# Altium footprint library andylib.PcbLib: 158 footprints (part 6 of 10)
Each footprint in its own frame and in the unit in brackets; x right, y up, seen from the top. Pads: shape width x height; smd on the part's side, far side on the other; paste and mask are expansions set on the pad; w line width, h text height; cw(c..) or ccw(c..) is an arc to the next point about the centre after c.
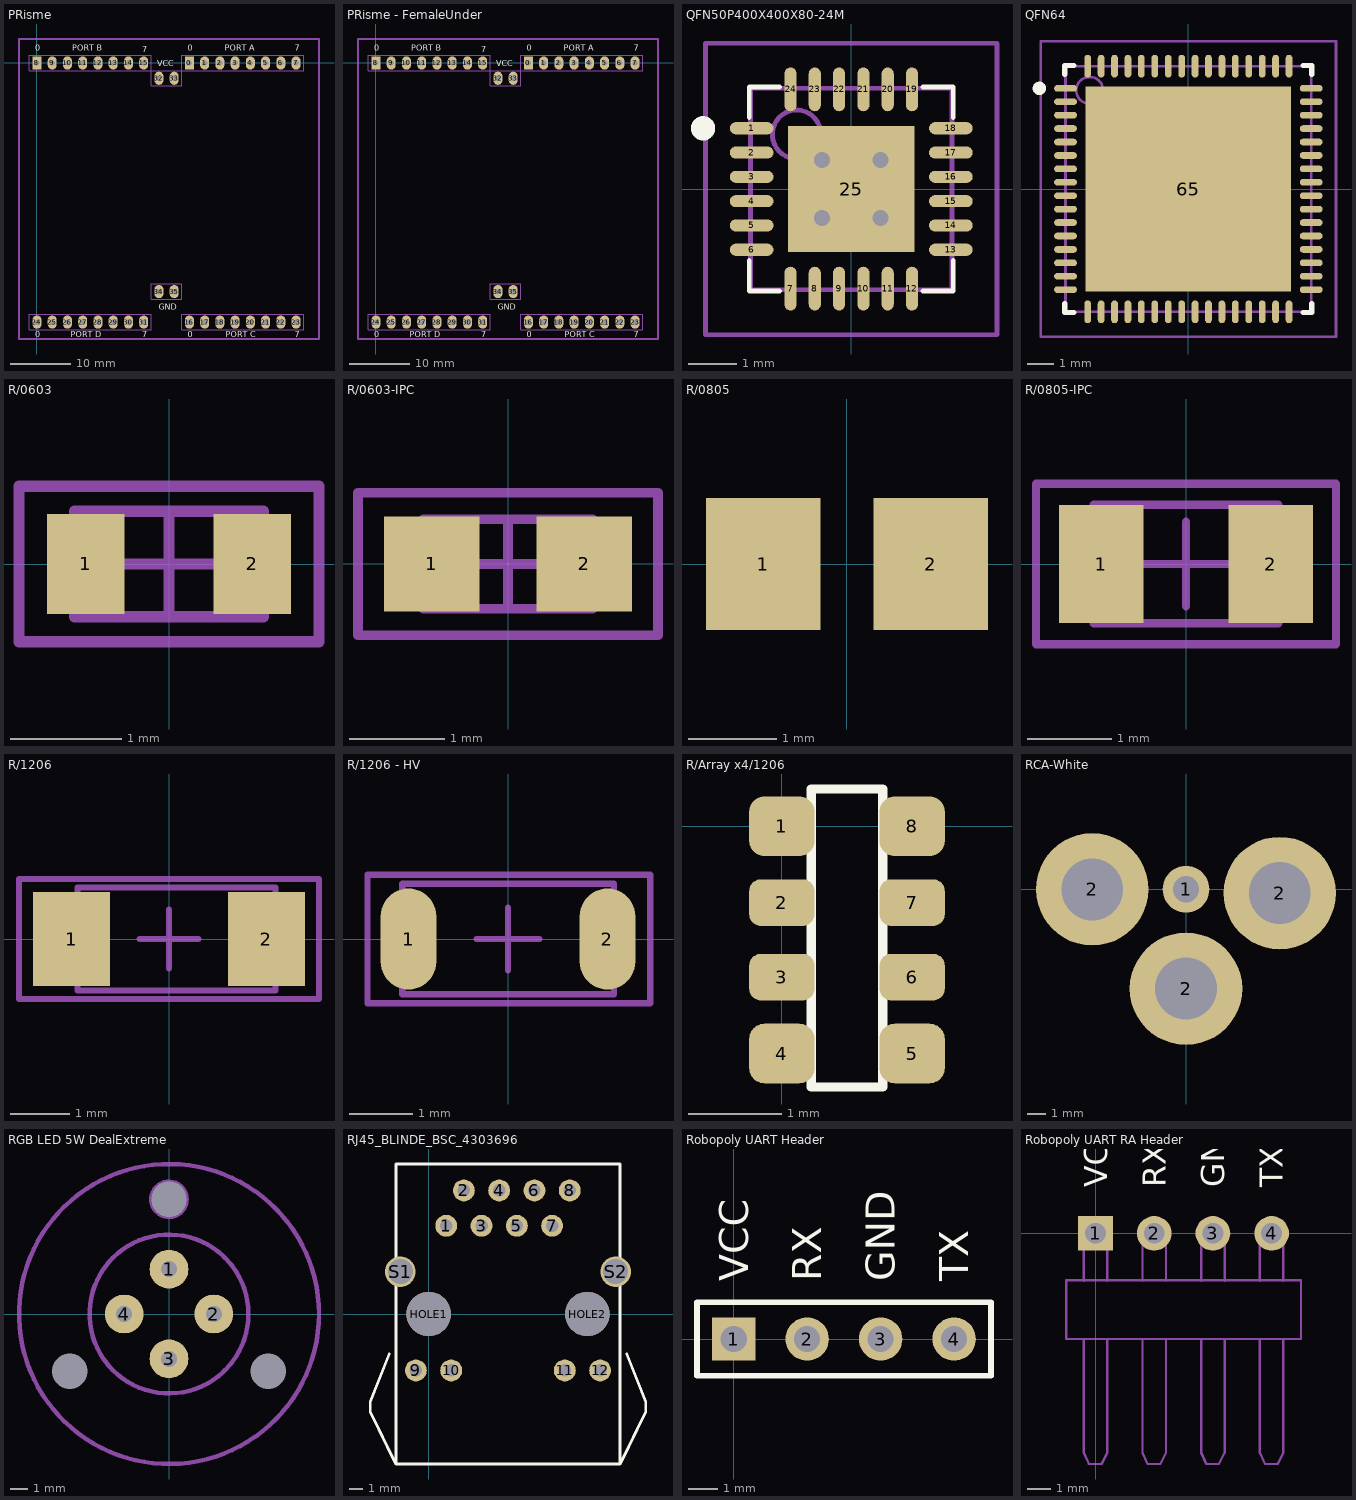
[diagram p5: the footprints below, top view; thin cyan lines are the x and y axes]

## PRisme [mm] "Robopoly PRisme"
pads (36):
  rect 1.5x2.2 hole 0.9: 0(25.4,0) 8(0,0)
  oval 1.5x2.2 hole 0.9: 1(27.94,0) 2(30.48,0) 3(33.02,0) 4(35.56,0) 5(38.1,0) 6(40.64,0) 7(43.18,0) 9(2.54,0) 10(5.08,0) 11(7.62,0) 12(10.16,0) 13(12.7,0) 14(15.24,0) 15(17.78,0) 16(25.4,-43.18) 17(27.94,-43.18) 18(30.48,-43.18) 19(33.02,-43.18) 20(35.56,-43.18) 21(38.1,-43.18) 22(40.64,-43.18) 23(43.18,-43.18) 24(0,-43.18) 25(2.54,-43.18) 26(5.08,-43.18) 27(7.62,-43.18) 28(10.16,-43.18) 29(12.7,-43.18) 30(15.24,-43.18) 31(17.78,-43.18) 32(20.32,-2.54) 33(22.86,-2.54) 34(20.32,-38.1) 35(22.86,-38.1)
Top Overlay:
  text "7" at 17.526,1.778 h1
  text "7" at 42.926,2.032 h1
  text "7" at 42.926,-45.72 h1
  text "7" at 17.526,-45.72 h1
  text "0" at 25.146,-45.72 h1
  text "0" at -0.254,-45.72 h1
  text "0" at -0.254,2.032 h1
  text "0" at 25.146,2.032 h1
  text "GND" at 20.32,-41.148 h1
  text "VCC" at 20.066,-0.508 h1
  text "PORT A" at 31.3,2 h1
  text "PORT B" at 5.9,2 h1
  text "PORT C" at 31.496,-45.72 h1
  text "PORT D" at 5.588,-45.72 h1
Mechanical 13:
  lines w0.2: 19.05,-1.27 19.05,1.27 -1.27,1.27 -1.27,-1.27 19.05,-1.27 ; 19.05,-1.27 24.13,-1.27 ; 19.05,-1.27 19.05,-3.81 24.13,-3.81 24.13,-1.27 ; 24.13,-1.27 24.13,1.27 44.45,1.27 44.45,-1.27 24.13,-1.27 ; -1.27,-44.45 19.05,-44.45 19.05,-41.91 -1.27,-41.91 -1.27,-44.45 ; 19.05,-39.37 24.13,-39.37 24.13,-36.83 19.05,-36.83 19.05,-39.37 ; 24.13,-44.45 44.45,-44.45 44.45,-41.91 24.13,-41.91 24.13,-44.45
  lines w0.3: -3,-46 -3,4 47,4 47,-46 -3,-46

## PRisme - FemaleUnder [mm] "Robopoly PRisme - Underside Female Connectors"
pads (36):
  rect 1.5x2.2 hole 0.9: 0(25.4,0) 8(0,0)
  oval 1.5x2.2 hole 0.9: 1(27.94,0) 2(30.48,0) 3(33.02,0) 4(35.56,0) 5(38.1,0) 6(40.64,0) 7(43.18,0) 9(2.54,0) 10(5.08,0) 11(7.62,0) 12(10.16,0) 13(12.7,0) 14(15.24,0) 15(17.78,0) 16(25.4,-43.18) 17(27.94,-43.18) 18(30.48,-43.18) 19(33.02,-43.18) 20(35.56,-43.18) 21(38.1,-43.18) 22(40.64,-43.18) 23(43.18,-43.18) 24(0,-43.18) 25(2.54,-43.18) 26(5.08,-43.18) 27(7.62,-43.18) 28(10.16,-43.18) 29(12.7,-43.18) 30(15.24,-43.18) 31(17.78,-43.18) 32(20.32,-2.54) 33(22.86,-2.54) 34(20.32,-38.1) 35(22.86,-38.1)
Top Overlay:
  text "PORT D" at 5.588,-45.72 h1
  text "PORT C" at 31.496,-45.72 h1
  text "PORT B" at 5.9,2 h1
  text "PORT A" at 31.3,2 h1
  text "VCC" at 20.066,-0.508 h1
  text "GND" at 20.32,-41.148 h1
  text "0" at 25.146,2.032 h1
  text "0" at -0.254,2.032 h1
  text "0" at -0.254,-45.72 h1
  text "0" at 25.146,-45.72 h1
  text "7" at 17.526,-45.72 h1
  text "7" at 42.926,-45.72 h1
  text "7" at 42.926,2.032 h1
  text "7" at 17.526,1.778 h1
Mechanical 13:
  lines w0.2: 19.05,-1.27 19.05,-3.81 24.13,-3.81 24.13,-1.27 ; 19.05,-1.27 24.13,-1.27 ; 19.05,-1.27 -1.27,-1.27 -1.27,1.27 19.05,1.27 19.05,-1.27 ; 24.13,-1.27 44.45,-1.27 44.45,1.27 24.13,1.27 24.13,-1.27 ; -1.27,-44.45 -1.27,-41.91 19.05,-41.91 19.05,-44.45 -1.27,-44.45 ; 19.05,-39.37 19.05,-36.83 24.13,-36.83 24.13,-39.37 19.05,-39.37 ; 24.13,-44.45 24.13,-41.91 44.45,-41.91 44.45,-44.45 24.13,-44.45
  lines w0.3: -3,-46 47,-46 47,4 -3,4 -3,-46
3D body: height 2.75, standoff -8.9, extent -1.395,-44.298 19.175,-41.798
3D body: height 2.75, standoff -8.9, extent 24.005,-44.43 44.575,-41.93
3D body: height 2.75, standoff -8.9, extent 24.005,-1.25 44.575,1.25
3D body: height 2.75, standoff -8.9, extent -1.395,-1.25 19.175,1.25
3D body: height 2.75, standoff -8.9, extent 18.925,-39.35 24.255,-36.85
3D body: height 2.75, standoff -8.9, extent 18.925,-3.79 24.255,-1.29

## QFN50P400X400X80-24M [mm] "QFN, 24-Leads, Body 4.2x4.2mm (max), Pitch 0.50mm, IPC Low Density"
height 0.8
pads (25):
  oval 0.9x0.25 smd: 1(-2.05,1.25) 2(-2.05,0.75) 3(-2.05,0.25) 4(-2.05,-0.25) 5(-2.05,-0.75) 6(-2.05,-1.25) 13(2.05,-1.25) 14(2.05,-0.75) 15(2.05,-0.25) 16(2.05,0.25) 17(2.05,0.75) 18(2.05,1.25)
  oval 0.25x0.9 smd: 7(-1.25,-2.05) 8(-0.75,-2.05) 9(-0.25,-2.05) 10(0.25,-2.05) 11(0.75,-2.05) 12(1.25,-2.05) 19(1.25,2.05) 20(0.75,2.05) 21(0.25,2.05) 22(-0.25,2.05) 23(-0.75,2.05) 24(-1.25,2.05)
  rect 2.6x2.6 smd: 25(0,0)
via 0.6,-0.6 diameter 0.66 hole 0.33
via -0.6,-0.6 diameter 0.66 hole 0.33
via 0.6,0.6 diameter 0.66 hole 0.33
via -0.6,0.6 diameter 0.66 hole 0.33
Top Overlay:
  circle w0.25: c-3.05,1.25 r0.125
  lines w0.1: -2.1,-1.475 -2.1,-2.1 -1.475,-2.1 ; -2.1,1.475 -2.1,2.1 -1.475,2.1 ; 1.475,-2.1 2.1,-2.1 2.1,-1.475 ; 1.475,2.1 2.1,2.1 2.1,1.475
Mechanical 13:
  circle w0.1: c-1.125,1.125 r0.5
  lines w0.1: -2.075,-2.075 2.075,-2.075 2.075,2.075 -2.075,2.075 -2.075,-2.075
Mechanical 15:
  lines w0.1: -0.5,0 0.5,0 ; 0,-0.5 0,0.5 ; -3,-3 3,-3 3,3 -3,3 -3,-3
3D body: height 0.8, standoff 0.08, extent -2.075,-2.075 2.075,2.075

## QFN64 [mm] "Quad Flat No Leads"
pads (65):
  oval 0.85x0.25 smd: 1(-4.575,3.75) 2(-4.575,3.25) 3(-4.575,2.75) 4(-4.575,2.25) 5(-4.575,1.75) 6(-4.575,1.25) 7(-4.575,0.75) 8(-4.575,0.25) 9(-4.575,-0.25) 10(-4.575,-0.75) 11(-4.575,-1.25) 12(-4.575,-1.75) 13(-4.575,-2.25) 14(-4.575,-2.75) 15(-4.575,-3.25) 16(-4.575,-3.75) 33(4.575,-3.75) 34(4.575,-3.25) 35(4.575,-2.75) 36(4.575,-2.25) 37(4.575,-1.75) 38(4.575,-1.25) 39(4.575,-0.75) 40(4.575,-0.25) 41(4.575,0.25) 42(4.575,0.75) 43(4.575,1.25) 44(4.575,1.75) 45(4.575,2.25) 46(4.575,2.75) 47(4.575,3.25) 48(4.575,3.75)
  oval 0.25x0.85 smd: 17(-3.75,-4.575) 18(-3.25,-4.575) 19(-2.75,-4.575) 20(-2.25,-4.575) 21(-1.75,-4.575) 22(-1.25,-4.575) 23(-0.75,-4.575) 24(-0.25,-4.575) 25(0.25,-4.575) 26(0.75,-4.575) 27(1.25,-4.575) 28(1.75,-4.575) 29(2.25,-4.575) 30(2.75,-4.575) 31(3.25,-4.575) 32(3.75,-4.575) 49(3.75,4.575) 50(3.25,4.575) 51(2.75,4.575) 52(2.25,4.575) 53(1.75,4.575) 54(1.25,4.575) 55(0.75,4.575) 56(0.25,4.575) 57(-0.25,4.575) 58(-0.75,4.575) 59(-1.25,4.575) 60(-1.75,4.575) 61(-2.25,4.575) 62(-2.75,4.575) 63(-3.25,4.575) 64(-3.75,4.575)
  rect 7.65x7.65 smd: 65(0,0)
Top Overlay:
  circle w0.25: c-5.55,3.75 r0.125
  lines w0.2: -4.6,-4.275 -4.6,-4.6 -4.275,-4.6 ; -4.6,4.275 -4.6,4.6 -4.275,4.6 ; 4.275,-4.6 4.6,-4.6 4.6,-4.275 ; 4.275,4.6 4.6,4.6 4.6,4.275
Mechanical 13:
  circle w0.1: c-3.675,3.675 r0.5
  lines w0.1: -4.575,-4.575 4.575,-4.575 4.575,4.575 -4.575,4.575 -4.575,-4.575
Mechanical 15:
  lines w0.1: -0.5,0 0.5,0 ; 0,-0.5 0,0.5 ; -5.5,-5.5 5.5,-5.5 5.5,5.5 -5.5,5.5 -5.5,-5.5
3D body: height 1, standoff 0, extent -4.578,-4.578 4.572,4.572

## R/0603 [mm] "Chip Resistor, Body 1.6x0.8mm, IPC High Density"
height 0.9
pads (2):
  rect 0.7x0.9 smd: 1(-0.75,0) 2(0.75,0)
Mechanical 13:
  lines w0.1: -0.85,-0.475 0.85,-0.475 0.85,0.475 -0.85,0.475 -0.85,-0.475
Mechanical 15:
  lines w0.1: -0.475,0 0.475,0 ; 0,-0.475 0,0.475 ; -1.35,-0.7 1.35,-0.7 1.35,0.7 -1.35,0.7 -1.35,-0.7
3D body: height 0.3, standoff 0, extent -0.8,-0.4 0.8,0.4

## R/0603-IPC [mm] "Chip Resistor, 2-Leads, Body 1.6x0.8mm, IPC Medium Density"
height 0.38
pads (2):
  rect 1x1 smd: 1(-0.8,0) 2(0.8,0)
Mechanical 13:
  lines w0.1: -0.89,-0.47 -0.89,0.47 0.89,0.47 0.89,-0.47 -0.89,-0.47
Mechanical 15:
  lines w0.1: -0.47,0 0.47,0 ; 0,-0.47 0,0.47 ; -1.575,-0.75 -1.575,0.75 1.575,0.75 1.575,-0.75 -1.575,-0.75
3D body: height 0.3, standoff 0, extent -0.8,-0.425 0.8,0.375

## R/0805 [mm] "Chip Resistor; Body 2.0 x 1.3 mm (LxW typ)"
height 2.54
pads (2):
  rect 1.3x1.5 smd: 1(-0.95,0) 2(0.95,0)
3D body: height 0.78, standoff 0, extent -1,-0.615 1,0.635

## R/0805-IPC [mm] "Chip Resistor, 2-Leads, Body 2.0x1.3mm, IPC Medium Density"
height 0.38
pads (2):
  rect 1x1.4 smd: 1(-1,0) 2(1,0)
Mechanical 13:
  lines w0.1: -1.09,-0.7 -1.09,0.7 1.09,0.7 1.09,-0.7 -1.09,-0.7
Mechanical 15:
  lines w0.1: -0.5,0 0.5,0 ; 0,-0.5 0,0.5 ; -1.775,-0.95 -1.775,0.95 1.775,0.95 1.775,-0.95 -1.775,-0.95
3D body: height 0.78, standoff 0, extent -1,-0.625 1,0.625

## R/1206 [mm] "Chip Resistor, Body 3.2x1.6mm, IPC Low Density"
height 0.71
pads (2):
  rect 1.3x1.6 smd: 1(-1.651,0) 2(1.651,0)
Mechanical 13:
  lines w0.1: -1.548,-0.875 -1.548,0.875 1.802,0.875 1.802,-0.875 -1.548,-0.875
Mechanical 15:
  lines w0.1: -0.5,0 0.5,0 ; 0,-0.5 0,0.5 ; -2.54,-1.016 -2.54,1.016 2.54,1.016 2.54,-1.016 -2.54,-1.016
3D body: height 1, standoff 0, extent -1.6,-0.8 1.6,0.8

## R/1206 - HV [mm] "Chip Resistor, Body 3.2x1.6mm, High Voltage"
height 0.71
pads (2):
  oval 0.88x1.6 smd: 1(-1.575,0) 2(1.575,0)
Top Solder:
  rectangle: -2.125,-0.95 2.125,0.925
Mechanical 13:
  lines w0.1: -1.673,-0.875 -1.673,0.875 1.677,0.875 1.677,-0.875 -1.673,-0.875
Mechanical 15:
  lines w0.1: -0.5,0 0.5,0 ; 0,-0.5 0,0.5 ; -2.225,-1.016 -2.225,1.016 2.25,1.016 2.25,-1.016 -2.225,-1.016
3D body: height 1, standoff 0, extent -1.6,-0.8 1.6,0.8

## R/Array x4/1206 [mm] "4x0603 (Total 1206)"
pads (8):
  rrect50% 0.7x0.64 smd: 1(0,0) 4(0,-2.44) 5(1.4,-2.44) 8(1.4,0)
  rrect50% 0.7x0.5 smd: 2(0,-0.82) 3(0,-1.62) 6(1.4,-1.62) 7(1.4,-0.82)
Top Overlay:
  lines w0.1: 0.5,0.4 1.085,0.4 1.085,-2.8 0.315,-2.8 0.315,0.4 0.9,0.4
3D body: height 0.5, standoff 0, extent -0.165,-2.819 1.435,0.381

## RCA-White [mm] "RCA Through Hole Jack - White"
height 12
pads (4):
  round 2.5 hole 1.4: 1(0,0)
  round 6 hole 3.3: 2(-5,0) 2(0,-5.3) 2(5,-0.2)
3D body: height 12, standoff -4.2, extent -5.8,-13.1 5.8,1.4

## RGB LED 5W DealExtreme [mm] "5W RGB LED from DealExtreme / SKU 20999"
pads (7):
  round 0 hole 2 unplated paste+0 mask+0: 0(-5.63,-3.25) 0(0,6.5) 0(5.63,-3.25)
  round 2.2 hole 0.9 unplated paste+0 mask+0: 1(0,2.54) 2(2.54,0) 3(0,-2.54) 4(-2.54,0)
Mechanical 13:
  circle w0.254: c0,6.5 r1
  circle w0.254: c0,0 r4.5
  circle w0.254: c0,0 r8.5
3D body: height 6, standoff -15, extent -8.5,-8.5 8.5,8.5

## RJ45_BLINDE_BSC_4303696 [mm]
pads (16):
  round 1.574 / inner round 1.778 / far side round 1.574 hole 0.9 mask+0.128: 1(1.27,6.35) 2(2.54,8.89) 3(3.81,6.35) 4(5.08,8.89) 5(6.35,6.35) 6(7.62,8.89) 7(8.89,6.35) 8(10.16,8.89) 9(-0.914,-4.064) 10(1.626,-4.064) 11(9.804,-4.064) 12(12.344,-4.064)
  round 3.2 hole 3.2 unplated: HOLE1(0,0) HOLE2(11.43,0)
  round 2.2 / inner round 2.4 / far side round 2.2 hole 1.8 mask+0.1: S1(-2.032,3.048) S2(13.462,3.048)
Top Overlay:
  lines w0.2: -2.832,-2.883 -4.204,-6.312 -4.204,-7.036 -2.349,-10.795 ; 14.262,-2.883 15.634,-6.312 15.634,-7.036 13.779,-10.795 ; -2.349,-10.795 -2.349,10.795 13.779,10.795 13.779,-10.795 ; -2.349,-10.795 13.779,-10.795
  text ".Designator" at 6.27,-9.578 h1.43
Mechanical 1:
  text ".Designator" at 1.27,14.922 h1.43
  text ".Comment" at 1.27,12.065 h1.43
  text "LU1T041-43_3" at 1.27,9.207 h1.43
  text ".Pattern" at 1.27,6.35 h1.43
Mechanical 2:
  text "FCC_RJ45_BLINDE_BSC_4303696" at 16.017,13.299 h0.57
3D body: height 3.5, standoff -13.6, extent -2.208,-11.08 13.792,10.42

## Robopoly UART Header [mm] "Connector; Header; 4 Position"
pads (4):
  rect 1.5x1.5 hole 0.9: 1(0,0)
  round 1.5 hole 0.9: 2(2.54,0) 3(5.08,0) 4(7.62,0)
Top Overlay:
  lines w0.2: -1.27,-1.27 -1.27,1.27 8.89,1.27 8.89,-1.27 -1.27,-1.27
  text "VCC" at 0.5,2 h1
  text "RX" at 3.033,2 h1
  text "GND" at 5.567,2 h1
  text "TX" at 8.1,2 h1
3D body: height 8.43, standoff -2.55, extent -1.27,-1.27 8.89,1.27

## Robopoly UART RA Header [mm] "Connector; Header; Right Angle; 4 Position"
pads (4):
  rect 1.5x1.5 hole 0.9: 1(0,0)
  round 1.5 hole 0.9: 2(2.54,0) 3(5.08,0) 4(7.62,0)
Top Overlay:
  text "VCC" at 0.5,2 h1
  text "RX" at 3.033,2 h1
  text "GND" at 5.567,2 h1
  text "TX" at 8.1,2 h1
Mechanical 13:
  lines w0.1: -0.508,-4.572 -0.508,-9.5 -0.287,-9.982 0.267,-9.982 0.508,-9.5 0.508,-4.572 ; -0.508,-2.046 -0.508,-0.381 ; 0.508,-2.046 0.508,-0.381 ; 2.032,-4.572 2.032,-9.5 2.253,-9.982 2.807,-9.982 3.048,-9.5 3.048,-4.572 ; 2.032,-2.046 2.032,-0.381 ; 3.048,-2.046 3.048,-0.381 ; 4.572,-4.572 4.572,-9.5 4.793,-9.982 5.347,-9.982 5.588,-9.5 5.588,-4.572 ; 4.572,-2.046 4.572,-0.381 ; 5.588,-2.046 5.588,-0.381 ; 7.112,-4.572 7.112,-9.5 7.333,-9.982 7.887,-9.982 8.128,-9.5 8.128,-4.572 ; 7.112,-2.046 7.112,-0.381 ; 8.128,-2.046 8.128,-0.381 ; -1.27,-4.572 -1.27,-2.032 8.89,-2.032 8.89,-4.572 -1.27,-4.572
3D body: height 2.54, standoff -3, extent -1.295,-10.03 8.865,0.33